# Altium footprint library ConnectorsTDH.PcbLib: 194 footprints (part 1 of 13)
Each footprint in its own frame and in the unit in brackets; x right, y up, seen from the top. Pads: shape width x height; smd on the part's side, far side on the other; paste and mask are expansions set on the pad; w line width, h text height; cw(c..) or ccw(c..) is an arc to the next point about the centre after c.
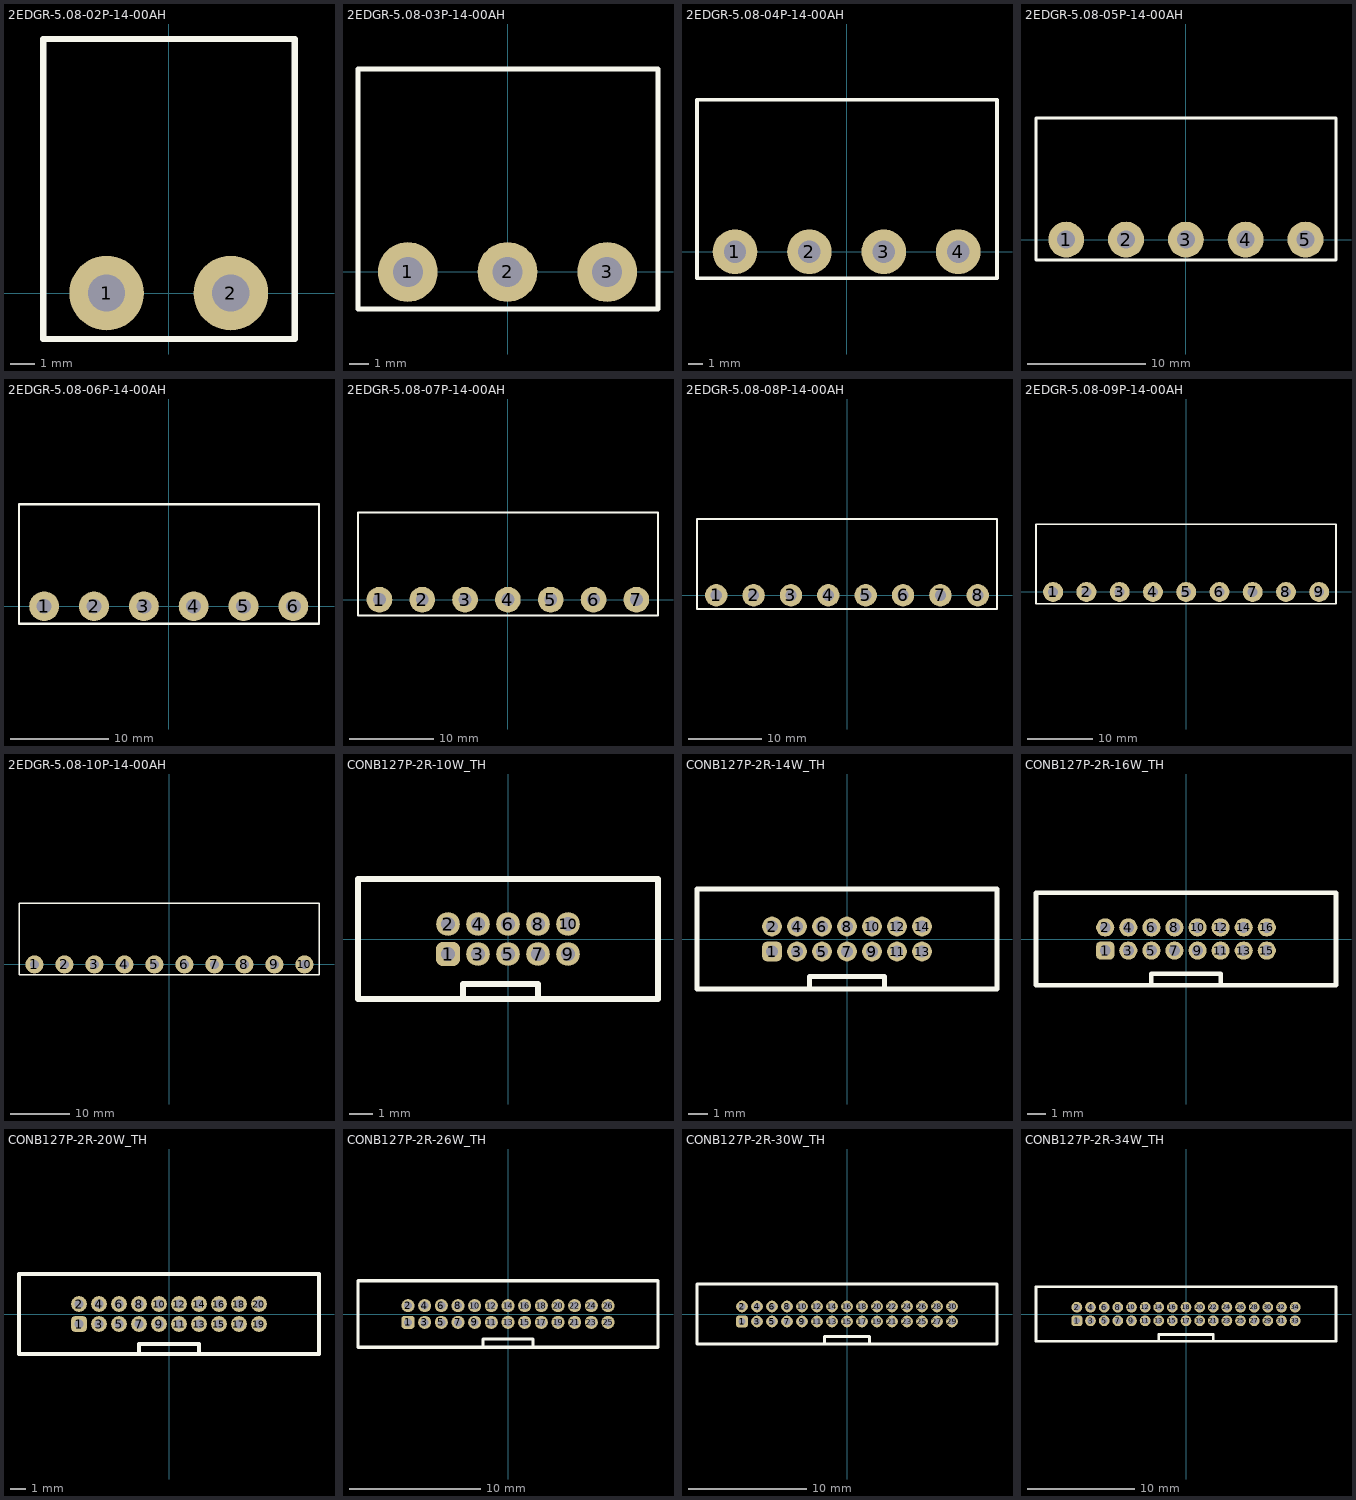
[diagram p0: the footprints below, top view; thin cyan lines are the x and y axes]

## 2EDGR-5.08-02P-14-00AH [mil]
pads (2):
  round 120 hole 60: 1(-100,0) 2(100,0)
Top Overlay:
  lines w10: -202,-74 203,-74 203,409 -202,409 -202,-74
3D body "2EDGR-5.08-02P-14-00AH.STEP": height 322.83, standoff -157.48, extent -200,-70 200,406.38

## 2EDGR-5.08-03P-14-00AH [mil]
pads (3):
  round 120 hole 60: 1(-200,0) 2(0,0) 3(200,0)
Top Overlay:
  lines w10: -300,-74 302,-74 302,407 -300,407 -300,-74
3D body "2EDGR-5.08-03P-14-00AH.STEP": height 322.83, standoff -157.48, extent -300,-70 300,406.38

## 2EDGR-5.08-04P-14-00AH [mil]
pads (4):
  round 120 hole 60: 1(-300,0) 2(-100,0) 3(100,0) 4(300,0)
Top Overlay:
  lines w10: -402,-71 404,-71 404,408 -402,408 -402,-71
3D body "2EDGR-5.08-04P-14-00AH.STEP": height 322.83, standoff -157.48, extent -400,-70 400,406.38

## 2EDGR-5.08-05P-14-00AH [mil]
pads (5):
  round 120 hole 60: 1(-400,0) 2(-200,0) 3(0,0) 4(200,0) 5(400,0)
Top Overlay:
  lines w10: -501,-69 502,-69 502,407 -501,407 -501,-69
3D body "2EDGR-5.08-05P-14-00AH.STEP": height 322.83, standoff -157.48, extent -500,-70 500,406.38

## 2EDGR-5.08-06P-14-00AH [mil]
pads (6):
  round 120 hole 60: 1(-500,0) 2(-300,0) 3(-100,0) 4(100,0) 5(300,0) 6(500,0)
Top Overlay:
  lines w10: -601,-70 603,-70 603,409 -601,409 -601,-70
3D body "2EDGR-5.08-06P-14-00AH.STEP": height 322.83, standoff -157.48, extent -600,-70 600,406.38

## 2EDGR-5.08-07P-14-00AH [mil]
pads (7):
  round 120 hole 60: 1(-600,0) 2(-400,0) 3(-200,0) 4(0,0) 5(200,0) 6(400,0) 7(600,0)
Top Overlay:
  lines w10: -700,-74 701,-74 701,407 -700,407 -700,-74
3D body "2EDGR-5.08-07P-14-00AH.STEP": height 322.83, standoff -157.48, extent -700,-70 700,406.38

## 2EDGR-5.08-08P-14-00AH [mil]
pads (8):
  round 120 hole 60: 1(-700,0) 2(-500,0) 3(-300,0) 4(-100,0) 5(100,0) 6(300,0) 7(500,0) 8(700,0)
Top Overlay:
  lines w10: -803,-73 803,-73 803,408 -803,408 -803,-73
3D body "2EDGR-5.08-08P-14-00AH.STEP": height 322.83, standoff -157.48, extent -800,-70 800,406.38

## 2EDGR-5.08-09P-14-00AH [mil]
pads (9):
  round 120 hole 60: 1(-800,0) 2(-600,0) 3(-400,0) 4(-200,0) 5(0,0) 6(200,0) 7(400,0) 8(600,0) 9(800,0)
Top Overlay:
  lines w10: -903,-71 901,-71 901,407 -903,407 -903,-71
3D body "2EDGR-5.08-09P-14-00AH.STEP": height 322.83, standoff -157.48, extent -900,-70 900,406.38

## 2EDGR-5.08-10P-14-00AH [mil]
pads (10):
  round 120 hole 60: 1(-900,0) 2(-700,0) 3(-500,0) 4(-300,0) 5(-100,0) 6(100,0) 7(300,0) 8(500,0) 9(700,0) 10(900,0)
Top Overlay:
  lines w10: -1003,-69 997,-69 997,408 -1003,408 -1003,-69
3D body "2EDGR-5.08-10P-14-00AH.STEP": height 322.83, standoff -157.48, extent -1000,-70 1000,406.38

## CONB127P-2R-10W_TH [mm]
pads (10):
  rrect50% 1x1 hole 0.6: 1(-2.54,-0.635)
  round 1 hole 0.6: 2(-2.54,0.635) 3(-1.27,-0.635) 4(-1.27,0.635) 5(0,-0.635) 6(0,0.635) 7(1.27,-0.635) 8(1.27,0.635) 9(2.54,-0.635) 10(2.54,0.635)
Top Overlay:
  lines w0.254: -1.905,-2.54 -1.905,-1.905 1.27,-1.905 1.27,-2.54 ; -6.35,-2.54 6.35,-2.54 6.35,2.54 -6.35,2.54 -6.35,-2.54
3D body "CONB127P-2R-10W_TH.STEP": height 5.4, standoff -2.1, extent -6.325,-2.65 6.325,2.55

## CONB127P-2R-14W_TH [mm]
pads (14):
  rrect50% 1x1 hole 0.6: 1(-3.81,-0.635)
  round 1 hole 0.6: 2(-3.81,0.635) 3(-2.54,-0.635) 4(-2.54,0.635) 5(-1.27,-0.635) 6(-1.27,0.635) 7(0,-0.635) 8(0,0.635) 9(1.27,-0.635) 10(1.27,0.635) 11(2.54,-0.635) 12(2.54,0.635) 13(3.81,-0.635) 14(3.81,0.635)
Top Overlay:
  lines w0.254: -1.905,-2.54 -1.905,-1.905 1.905,-1.905 1.905,-2.54 ; -7.62,-2.54 -7.62,2.54 7.62,2.54 7.62,-2.54 -7.62,-2.54
3D body "CONB127P-2R-14W_TH.STEP": height 5.4, standoff -2.1, extent -7.595,-2.65 7.595,2.55

## CONB127P-2R-16W_TH [mm]
pads (16):
  rrect50% 1x1 hole 0.6: 1(-4.445,-0.635)
  round 1 hole 0.6: 2(-4.445,0.635) 3(-3.175,-0.635) 4(-3.175,0.635) 5(-1.905,-0.635) 6(-1.905,0.635) 7(-0.635,-0.635) 8(-0.635,0.635) 9(0.635,-0.635) 10(0.635,0.635) 11(1.905,-0.635) 12(1.905,0.635) 13(3.175,-0.635) 14(3.175,0.635) 15(4.445,-0.635) 16(4.445,0.635)
Top Overlay:
  lines w0.254: -1.905,-2.54 -1.905,-1.905 1.905,-1.905 1.905,-2.54 ; -8.255,-2.54 -8.255,2.54 8.255,2.54 8.255,-2.54 -8.255,-2.54
3D body "CONB127P-2R-16W_TH.STEP": height 5.4, standoff -2.1, extent -8.23,-2.65 8.23,2.55

## CONB127P-2R-20W_TH [mm]
pads (20):
  rrect50% 1x1 hole 0.6: 1(-5.715,-0.635)
  round 1 hole 0.6: 2(-5.715,0.635) 3(-4.445,-0.635) 4(-4.445,0.635) 5(-3.175,-0.635) 6(-3.175,0.635) 7(-1.905,-0.635) 8(-1.905,0.635) 9(-0.635,-0.635) 10(-0.635,0.635) 11(0.635,-0.635) 12(0.635,0.635) 13(1.905,-0.635) 14(1.905,0.635) 15(3.175,-0.635) 16(3.175,0.635) 17(4.445,-0.635) 18(4.445,0.635) 19(5.715,-0.635) 20(5.715,0.635)
Top Overlay:
  lines w0.254: -1.905,-2.54 -1.905,-1.905 1.905,-1.905 1.905,-2.54 ; -9.525,-2.54 9.525,-2.54 9.525,2.54 -9.525,2.54 -9.525,-2.54
3D body "CONB127P-2R-20W_TH.STEP": height 5.4, standoff -2.1, extent -9.5,-2.65 9.5,2.55

## CONB127P-2R-26W_TH [mm]
pads (26):
  rrect50% 1x1 hole 0.6: 1(-7.62,-0.635)
  round 1 hole 0.6: 2(-7.62,0.635) 3(-6.35,-0.635) 4(-6.35,0.635) 5(-5.08,-0.635) 6(-5.08,0.635) 7(-3.81,-0.635) 8(-3.81,0.635) 9(-2.54,-0.635) 10(-2.54,0.635) 11(-1.27,-0.635) 12(-1.27,0.635) 13(0,-0.635) 14(0,0.635) 15(1.27,-0.635) 16(1.27,0.635) 17(2.54,-0.635) 18(2.54,0.635) 19(3.81,-0.635) 20(3.81,0.635) 21(5.08,-0.635) 22(5.08,0.635) 23(6.35,-0.635) 24(6.35,0.635) 25(7.62,-0.635) 26(7.62,0.635)
Top Overlay:
  lines w0.254: -1.905,-2.54 -1.905,-1.905 1.905,-1.905 1.905,-2.54 ; -11.43,-2.54 -11.43,2.54 11.43,2.54 11.43,-2.54 -11.43,-2.54
3D body "CONB127P-2R-26W_TH.STEP": height 5.4, standoff -2.1, extent -11.405,-2.65 11.405,2.55

## CONB127P-2R-30W_TH [mm]
pads (30):
  rrect50% 1x1 hole 0.6: 1(-8.89,-0.635)
  round 1 hole 0.6: 2(-8.89,0.635) 3(-7.62,-0.635) 4(-7.62,0.635) 5(-6.35,-0.635) 6(-6.35,0.635) 7(-5.08,-0.635) 8(-5.08,0.635) 9(-3.81,-0.635) 10(-3.81,0.635) 11(-2.54,-0.635) 12(-2.54,0.635) 13(-1.27,-0.635) 14(-1.27,0.635) 15(0,-0.635) 16(0,0.635) 17(1.27,-0.635) 18(1.27,0.635) 19(2.54,-0.635) 20(2.54,0.635) 21(3.81,-0.635) 22(3.81,0.635) 23(5.08,-0.635) 24(5.08,0.635) 25(6.35,-0.635) 26(6.35,0.635) 27(7.62,-0.635) 28(7.62,0.635) 29(8.89,-0.635) 30(8.89,0.635)
Top Overlay:
  lines w0.254: -1.905,-2.54 -1.905,-1.905 1.905,-1.905 1.905,-2.54 ; -12.7,-2.54 12.7,-2.54 12.7,2.54 -12.7,2.54 -12.7,-2.54
3D body "CONB127P-2R-30W_TH.STEP": height 5.4, standoff -2.1, extent -12.675,-2.65 12.675,2.55

## CONB127P-2R-34W_TH [mm]
pads (34):
  rrect50% 1x1 hole 0.6: 1(-10.16,-0.635)
  round 1 hole 0.6: 2(-10.16,0.635) 3(-8.89,-0.635) 4(-8.89,0.635) 5(-7.62,-0.635) 6(-7.62,0.635) 7(-6.35,-0.635) 8(-6.35,0.635) 9(-5.08,-0.635) 10(-5.08,0.635) 11(-3.81,-0.635) 12(-3.81,0.635) 13(-2.54,-0.635) 14(-2.54,0.635) 15(-1.27,-0.635) 16(-1.27,0.635) 17(0,-0.635) 18(0,0.635) 19(1.27,-0.635) 20(1.27,0.635) 21(2.54,-0.635) 22(2.54,0.635) 23(3.81,-0.635) 24(3.81,0.635) 25(5.08,-0.635) 26(5.08,0.635) 27(6.35,-0.635) 28(6.35,0.635) 29(7.62,-0.635) 30(7.62,0.635) 31(8.89,-0.635) 32(8.89,0.635) 33(10.16,-0.635) 34(10.16,0.635)
Top Overlay:
  lines w0.254: -2.54,-2.54 -2.54,-1.905 2.54,-1.905 2.54,-2.54 ; -13.97,-2.54 -13.97,2.54 13.97,2.54 13.97,-2.54 -13.97,-2.54
3D body "CONB127P-2R-34W_TH.STEP": height 5.4, standoff -2.1, extent -13.945,-2.65 13.945,2.55